# Altium schematic symbol library Wurth_Elektronik_Passive_rev16a.SCHLIB: 1143 symbols (part 3 of 27)
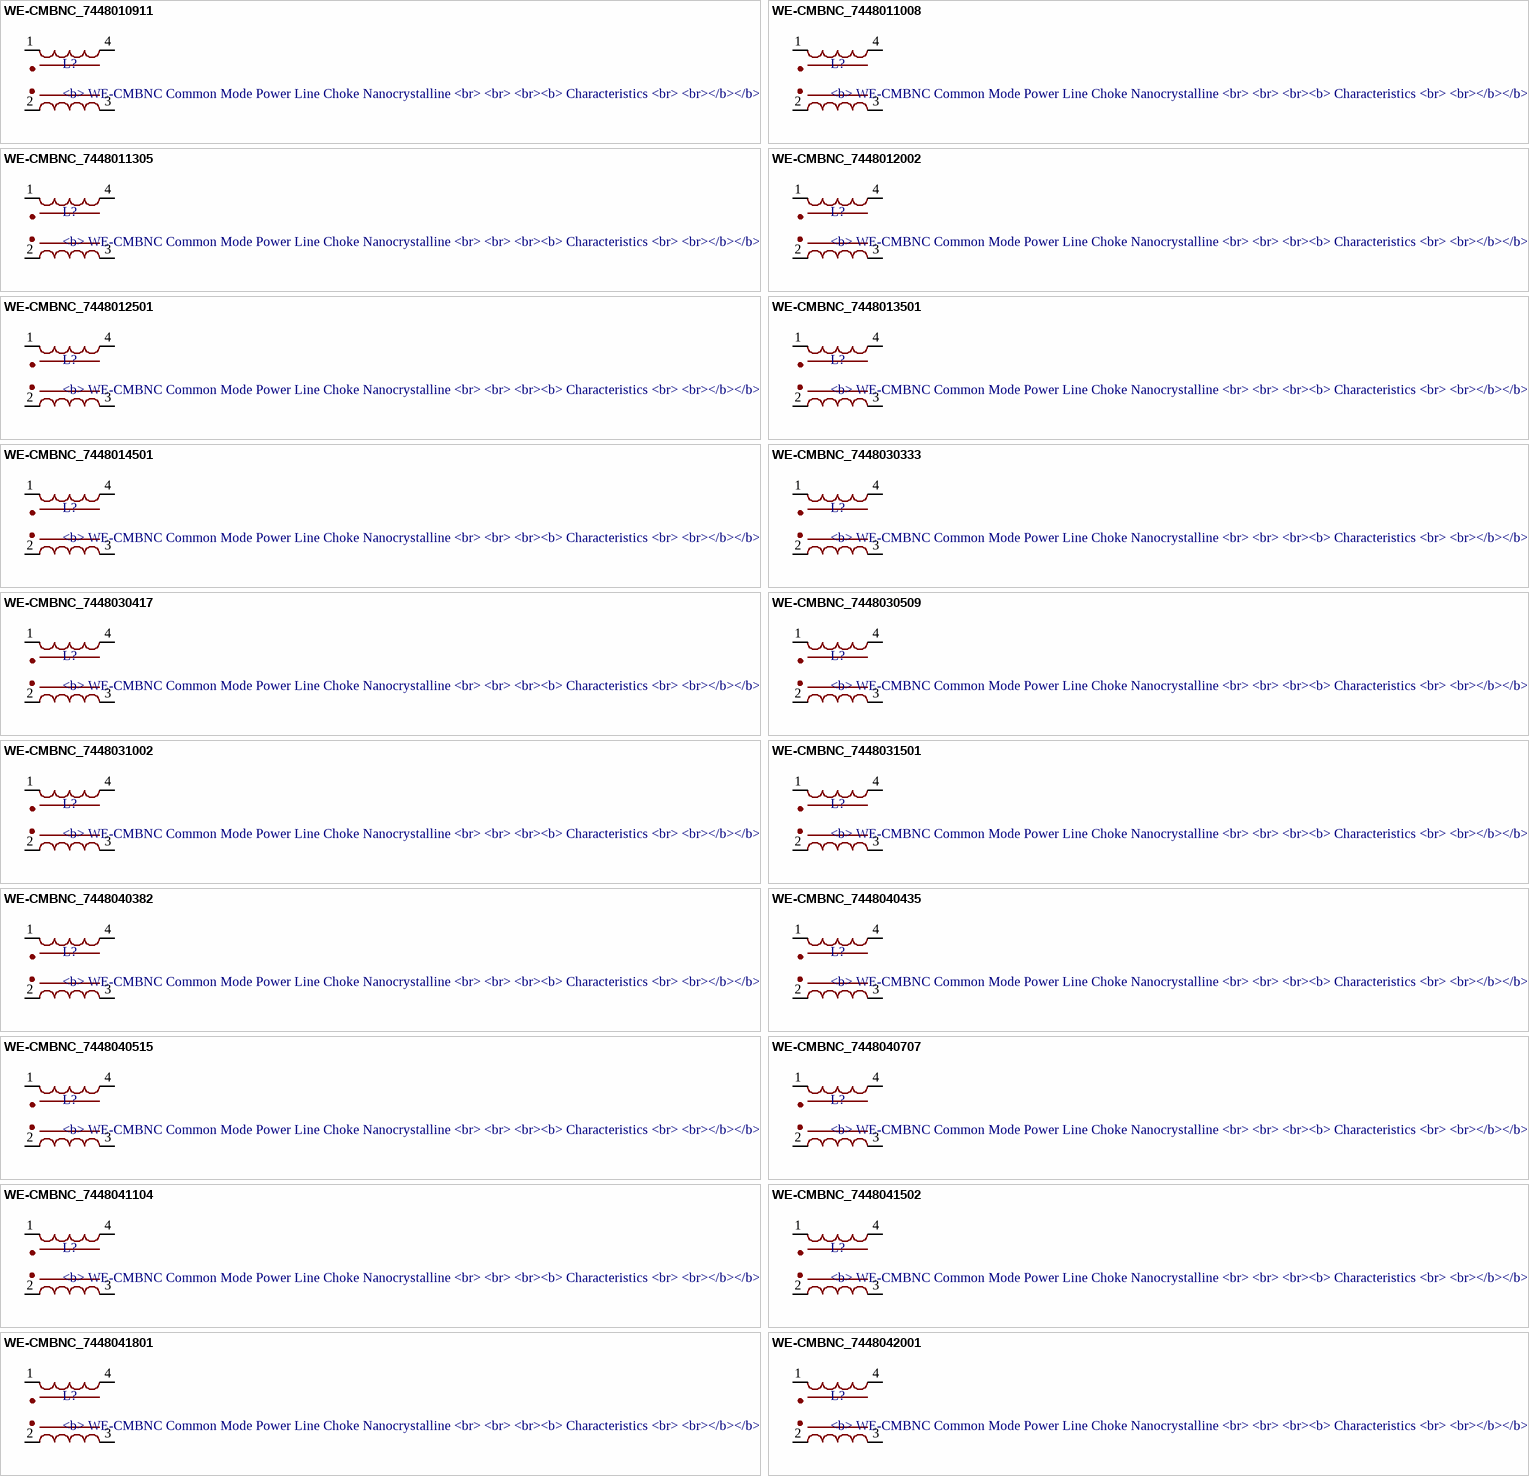
[diagram p60: symbols WE-CMBNC_7448010911 to WE-CMBNC_7448042001]

## WE-CMBNC_7448041104
designator L?, comment <b> WE-CMBNC Common Mode Power Line Choke Nanocrystalline / <br> / <br> / <br><b> Characteristics / <br> / <br></b></b> Very high permeability nanocrystalline core material / <br> / <br> Improved isolation through plastic case and winding spacer / <br> / <br>  High and stable inductance values at high temperatures / <br> / <br> High rated currents / <br> / <br> Broadband suppression / <br> / <br>  Small size / <br> / <br> Frequency range: 1 kHz-300 MHz / <br> / <br> Operating temperature: -40°C to +125°C / <br> / <br> / <br><b> Applications / <br> / <br></b> Power electronics / <br> / <br>  Power line in- and output filter / <br> / <br>  Radio interference suppression in motors / <br> / <br> Suppression for common mode noise / <br> / <br> / <br> / <br><a href="http://katalog.we-online.de/media/images/eisos/IndCMBNC_pf2.jpg" title="Enlarge picture"> / <img src="http://katalog.we-online.de/media/thumbs2/eisos/thb_IndCMBNC_pf2.jpg" width="320"></a><p> / Details see: <a href="http://katalog.we-online.de/en/pbs/WE-CMBNC/">http://katalog.we-online.de/en/pbs/WE-CMBNC/</a><p> / Updated by  Dan Xu 2014-06-23<br> / 2014 (C) Wurth Elektronik
footprint WE-CMBNC_L(WITHOUT-PINS)_7448041104
pins: 1, 2 4, 3, 4 2

## WE-CMBNC_7448041502
designator L?, comment <b> WE-CMBNC Common Mode Power Line Choke Nanocrystalline / <br> / <br> / <br><b> Characteristics / <br> / <br></b></b> Very high permeability nanocrystalline core material / <br> / <br> Improved isolation through plastic case and winding spacer / <br> / <br>  High and stable inductance values at high temperatures / <br> / <br> High rated currents / <br> / <br> Broadband suppression / <br> / <br>  Small size / <br> / <br> Frequency range: 1 kHz-300 MHz / <br> / <br> Operating temperature: -40°C to +125°C / <br> / <br> / <br><b> Applications / <br> / <br></b> Power electronics / <br> / <br>  Power line in- and output filter / <br> / <br>  Radio interference suppression in motors / <br> / <br> Suppression for common mode noise / <br> / <br> / <br> / <br><a href="http://katalog.we-online.de/media/images/eisos/IndCMBNC_pf2.jpg" title="Enlarge picture"> / <img src="http://katalog.we-online.de/media/thumbs2/eisos/thb_IndCMBNC_pf2.jpg" width="320"></a><p> / Details see: <a href="http://katalog.we-online.de/en/pbs/WE-CMBNC/">http://katalog.we-online.de/en/pbs/WE-CMBNC/</a><p> / Updated by  Dan Xu 2014-06-23<br> / 2014 (C) Wurth Elektronik
footprint WE-CMBNC_L(WITHOUT-PINS)_7448041502
pins: 1, 2 4, 3, 4 2

## WE-CMBNC_7448041801
designator L?, comment <b> WE-CMBNC Common Mode Power Line Choke Nanocrystalline / <br> / <br> / <br><b> Characteristics / <br> / <br></b></b> Very high permeability nanocrystalline core material / <br> / <br> Improved isolation through plastic case and winding spacer / <br> / <br>  High and stable inductance values at high temperatures / <br> / <br> High rated currents / <br> / <br> Broadband suppression / <br> / <br>  Small size / <br> / <br> Frequency range: 1 kHz-300 MHz / <br> / <br> Operating temperature: -40°C to +125°C / <br> / <br> / <br><b> Applications / <br> / <br></b> Power electronics / <br> / <br>  Power line in- and output filter / <br> / <br>  Radio interference suppression in motors / <br> / <br> Suppression for common mode noise / <br> / <br> / <br> / <br><a href="http://katalog.we-online.de/media/images/eisos/IndCMBNC_pf2.jpg" title="Enlarge picture"> / <img src="http://katalog.we-online.de/media/thumbs2/eisos/thb_IndCMBNC_pf2.jpg" width="320"></a><p> / Details see: <a href="http://katalog.we-online.de/en/pbs/WE-CMBNC/">http://katalog.we-online.de/en/pbs/WE-CMBNC/</a><p> / Updated by  Dan Xu 2014-06-23<br> / 2014 (C) Wurth Elektronik
footprint WE-CMBNC_L(WITHOUT-PINS)_7448041801
pins: 1, 2 4, 3, 4 2

## WE-CMBNC_7448042001
designator L?, comment <b> WE-CMBNC Common Mode Power Line Choke Nanocrystalline / <br> / <br> / <br><b> Characteristics / <br> / <br></b></b> Very high permeability nanocrystalline core material / <br> / <br> Improved isolation through plastic case and winding spacer / <br> / <br>  High and stable inductance values at high temperatures / <br> / <br> High rated currents / <br> / <br> Broadband suppression / <br> / <br>  Small size / <br> / <br> Frequency range: 1 kHz-300 MHz / <br> / <br> Operating temperature: -40°C to +125°C / <br> / <br> / <br><b> Applications / <br> / <br></b> Power electronics / <br> / <br>  Power line in- and output filter / <br> / <br>  Radio interference suppression in motors / <br> / <br> Suppression for common mode noise / <br> / <br> / <br> / <br><a href="http://katalog.we-online.de/media/images/eisos/IndCMBNC_pf2.jpg" title="Enlarge picture"> / <img src="http://katalog.we-online.de/media/thumbs2/eisos/thb_IndCMBNC_pf2.jpg" width="320"></a><p> / Details see: <a href="http://katalog.we-online.de/en/pbs/WE-CMBNC/">http://katalog.we-online.de/en/pbs/WE-CMBNC/</a><p> / Updated by  Dan Xu 2014-06-23<br> / 2014 (C) Wurth Elektronik
footprint WE-CMBNC_L(WITHOUT-PINS)_7448042001
pins: 1, 2 4, 3, 4 2

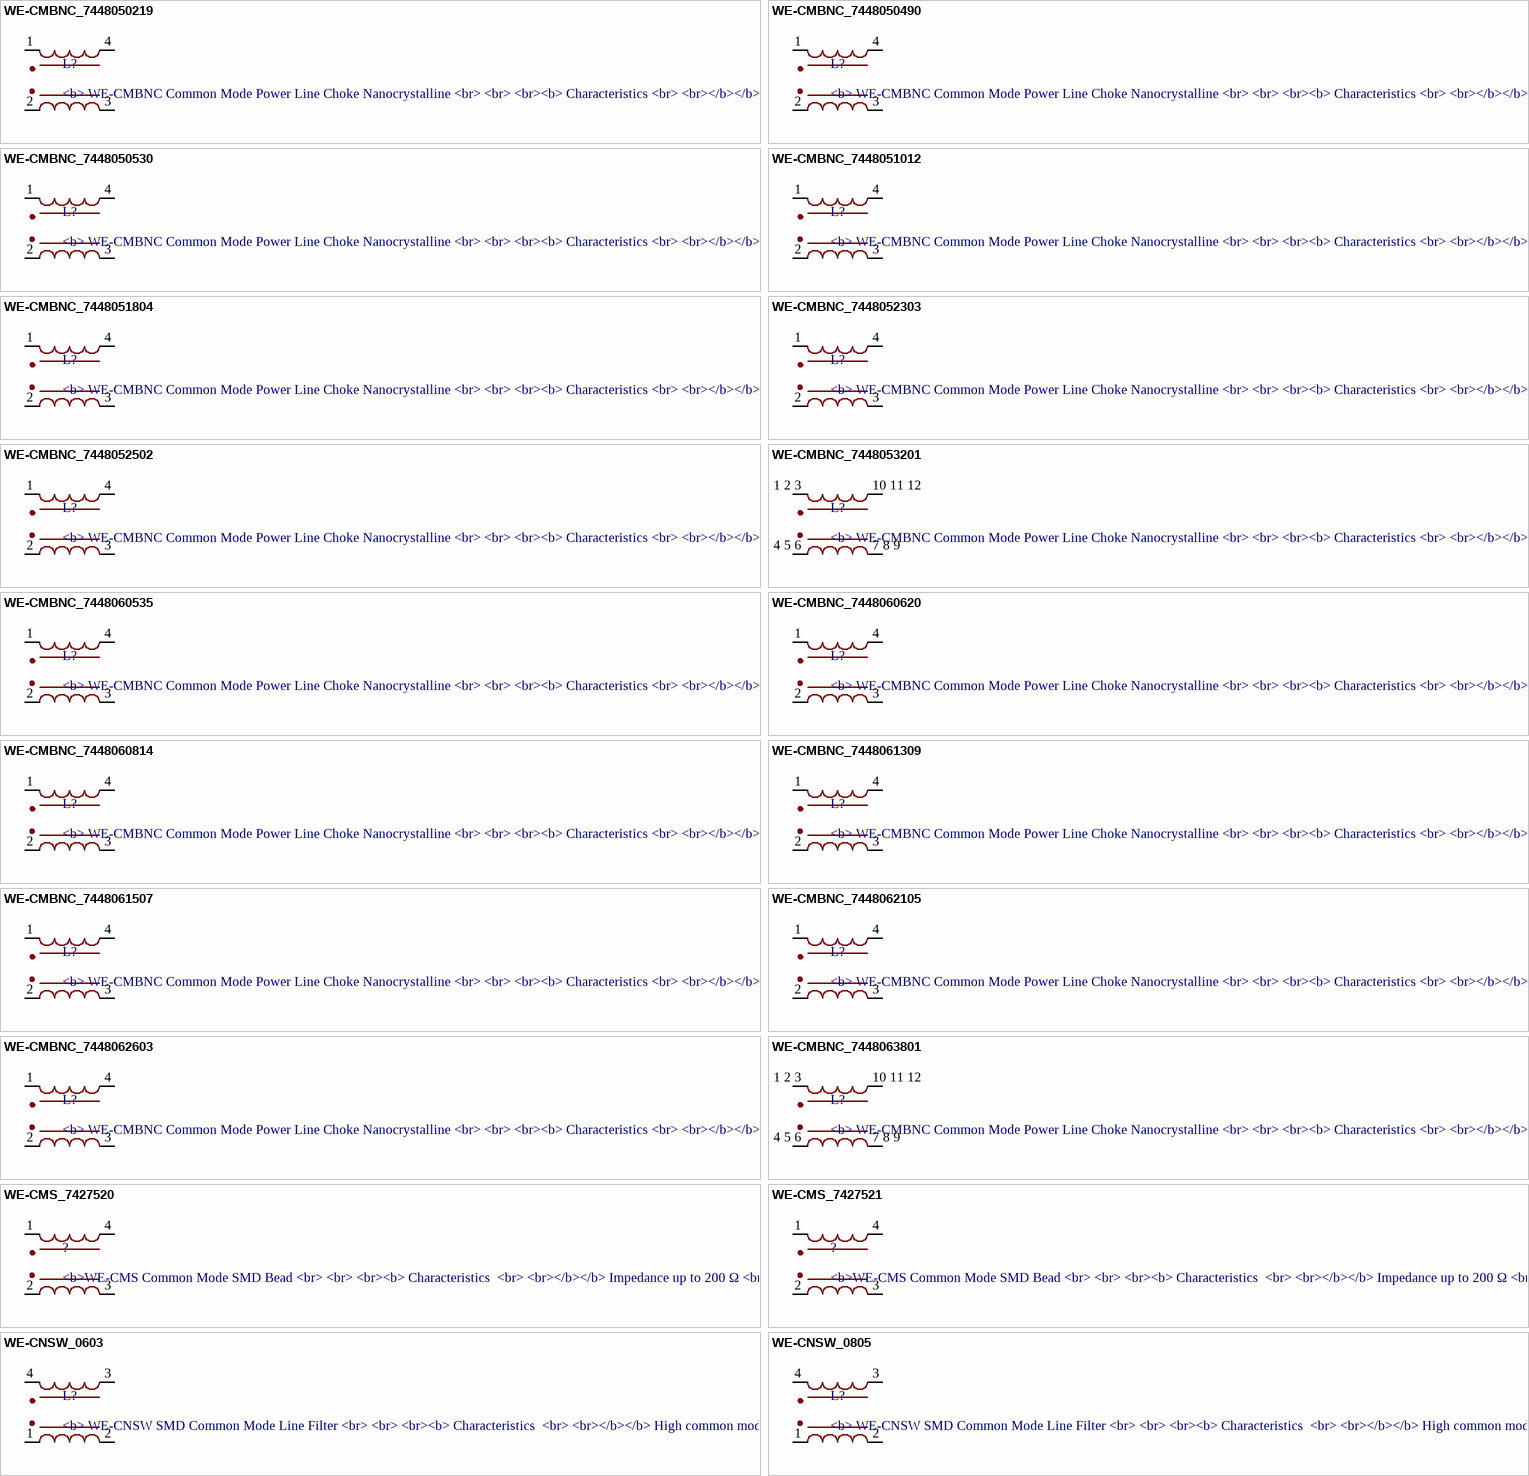
[diagram p3: symbols WE-CMBNC_7448050219 to WE-CNSW_0805]

## WE-CMBNC_7448050219
designator L?, comment <b> WE-CMBNC Common Mode Power Line Choke Nanocrystalline / <br> / <br> / <br><b> Characteristics / <br> / <br></b></b> Very high permeability nanocrystalline core material / <br> / <br> Improved isolation through plastic case and winding spacer / <br> / <br>  High and stable inductance values at high temperatures / <br> / <br> High rated currents / <br> / <br> Broadband suppression / <br> / <br>  Small size / <br> / <br> Frequency range: 1 kHz-300 MHz / <br> / <br> Operating temperature: -40°C to +125°C / <br> / <br> / <br><b> Applications / <br> / <br></b> Power electronics / <br> / <br>  Power line in- and output filter / <br> / <br>  Radio interference suppression in motors / <br> / <br> Suppression for common mode noise / <br> / <br> / <br> / <br><a href="http://katalog.we-online.de/media/images/eisos/IndCMBNC_pf2.jpg" title="Enlarge picture"> / <img src="http://katalog.we-online.de/media/thumbs2/eisos/thb_IndCMBNC_pf2.jpg" width="320"></a><p> / Details see: <a href="http://katalog.we-online.de/en/pbs/WE-CMBNC/">http://katalog.we-online.de/en/pbs/WE-CMBNC/</a><p> / Updated by  Dan Xu 2014-06-23<br> / 2014 (C) Wurth Elektronik
footprint WE-CMBNC_XL_7448050219
pins: 1, 2 4, 3, 4 2

## WE-CMBNC_7448050490
designator L?, comment <b> WE-CMBNC Common Mode Power Line Choke Nanocrystalline / <br> / <br> / <br><b> Characteristics / <br> / <br></b></b> Very high permeability nanocrystalline core material / <br> / <br> Improved isolation through plastic case and winding spacer / <br> / <br>  High and stable inductance values at high temperatures / <br> / <br> High rated currents / <br> / <br> Broadband suppression / <br> / <br>  Small size / <br> / <br> Frequency range: 1 kHz-300 MHz / <br> / <br> Operating temperature: -40°C to +125°C / <br> / <br> / <br><b> Applications / <br> / <br></b> Power electronics / <br> / <br>  Power line in- and output filter / <br> / <br>  Radio interference suppression in motors / <br> / <br> Suppression for common mode noise / <br> / <br> / <br> / <br><a href="http://katalog.we-online.de/media/images/eisos/IndCMBNC_pf2.jpg" title="Enlarge picture"> / <img src="http://katalog.we-online.de/media/thumbs2/eisos/thb_IndCMBNC_pf2.jpg" width="320"></a><p> / Details see: <a href="http://katalog.we-online.de/en/pbs/WE-CMBNC/">http://katalog.we-online.de/en/pbs/WE-CMBNC/</a><p> / Updated by  Dan Xu 2014-06-23<br> / 2014 (C) Wurth Elektronik
footprint WE-CMBNC_XL_7448050490
pins: 1, 2 4, 3, 4 2

## WE-CMBNC_7448050530
designator L?, comment <b> WE-CMBNC Common Mode Power Line Choke Nanocrystalline / <br> / <br> / <br><b> Characteristics / <br> / <br></b></b> Very high permeability nanocrystalline core material / <br> / <br> Improved isolation through plastic case and winding spacer / <br> / <br>  High and stable inductance values at high temperatures / <br> / <br> High rated currents / <br> / <br> Broadband suppression / <br> / <br>  Small size / <br> / <br> Frequency range: 1 kHz-300 MHz / <br> / <br> Operating temperature: -40°C to +125°C / <br> / <br> / <br><b> Applications / <br> / <br></b> Power electronics / <br> / <br>  Power line in- and output filter / <br> / <br>  Radio interference suppression in motors / <br> / <br> Suppression for common mode noise / <br> / <br> / <br> / <br><a href="http://katalog.we-online.de/media/images/eisos/IndCMBNC_pf2.jpg" title="Enlarge picture"> / <img src="http://katalog.we-online.de/media/thumbs2/eisos/thb_IndCMBNC_pf2.jpg" width="320"></a><p> / Details see: <a href="http://katalog.we-online.de/en/pbs/WE-CMBNC/">http://katalog.we-online.de/en/pbs/WE-CMBNC/</a><p> / Updated by  Dan Xu 2014-06-23<br> / 2014 (C) Wurth Elektronik
footprint WE-CMBNC_XL(WITHOUT-PINS)_7448050530
pins: 1, 2 4, 3, 4 2

## WE-CMBNC_7448051012
designator L?, comment <b> WE-CMBNC Common Mode Power Line Choke Nanocrystalline / <br> / <br> / <br><b> Characteristics / <br> / <br></b></b> Very high permeability nanocrystalline core material / <br> / <br> Improved isolation through plastic case and winding spacer / <br> / <br>  High and stable inductance values at high temperatures / <br> / <br> High rated currents / <br> / <br> Broadband suppression / <br> / <br>  Small size / <br> / <br> Frequency range: 1 kHz-300 MHz / <br> / <br> Operating temperature: -40°C to +125°C / <br> / <br> / <br><b> Applications / <br> / <br></b> Power electronics / <br> / <br>  Power line in- and output filter / <br> / <br>  Radio interference suppression in motors / <br> / <br> Suppression for common mode noise / <br> / <br> / <br> / <br><a href="http://katalog.we-online.de/media/images/eisos/IndCMBNC_pf2.jpg" title="Enlarge picture"> / <img src="http://katalog.we-online.de/media/thumbs2/eisos/thb_IndCMBNC_pf2.jpg" width="320"></a><p> / Details see: <a href="http://katalog.we-online.de/en/pbs/WE-CMBNC/">http://katalog.we-online.de/en/pbs/WE-CMBNC/</a><p> / Updated by  Dan Xu 2014-06-23<br> / 2014 (C) Wurth Elektronik
footprint WE-CMBNC_XL(WITHOUT-PINS)_7448051012
pins: 1, 2 4, 3, 4 2

## WE-CMBNC_7448051804
designator L?, comment <b> WE-CMBNC Common Mode Power Line Choke Nanocrystalline / <br> / <br> / <br><b> Characteristics / <br> / <br></b></b> Very high permeability nanocrystalline core material / <br> / <br> Improved isolation through plastic case and winding spacer / <br> / <br>  High and stable inductance values at high temperatures / <br> / <br> High rated currents / <br> / <br> Broadband suppression / <br> / <br>  Small size / <br> / <br> Frequency range: 1 kHz-300 MHz / <br> / <br> Operating temperature: -40°C to +125°C / <br> / <br> / <br><b> Applications / <br> / <br></b> Power electronics / <br> / <br>  Power line in- and output filter / <br> / <br>  Radio interference suppression in motors / <br> / <br> Suppression for common mode noise / <br> / <br> / <br> / <br><a href="http://katalog.we-online.de/media/images/eisos/IndCMBNC_pf2.jpg" title="Enlarge picture"> / <img src="http://katalog.we-online.de/media/thumbs2/eisos/thb_IndCMBNC_pf2.jpg" width="320"></a><p> / Details see: <a href="http://katalog.we-online.de/en/pbs/WE-CMBNC/">http://katalog.we-online.de/en/pbs/WE-CMBNC/</a><p> / Updated by  Dan Xu 2014-06-23<br> / 2014 (C) Wurth Elektronik
footprint WE-CMBNC_XL(WITHOUT-PINS)_7448051804
pins: 1, 2 4, 3, 4 2

## WE-CMBNC_7448052303
designator L?, comment <b> WE-CMBNC Common Mode Power Line Choke Nanocrystalline / <br> / <br> / <br><b> Characteristics / <br> / <br></b></b> Very high permeability nanocrystalline core material / <br> / <br> Improved isolation through plastic case and winding spacer / <br> / <br>  High and stable inductance values at high temperatures / <br> / <br> High rated currents / <br> / <br> Broadband suppression / <br> / <br>  Small size / <br> / <br> Frequency range: 1 kHz-300 MHz / <br> / <br> Operating temperature: -40°C to +125°C / <br> / <br> / <br><b> Applications / <br> / <br></b> Power electronics / <br> / <br>  Power line in- and output filter / <br> / <br>  Radio interference suppression in motors / <br> / <br> Suppression for common mode noise / <br> / <br> / <br> / <br><a href="http://katalog.we-online.de/media/images/eisos/IndCMBNC_pf2.jpg" title="Enlarge picture"> / <img src="http://katalog.we-online.de/media/thumbs2/eisos/thb_IndCMBNC_pf2.jpg" width="320"></a><p> / Details see: <a href="http://katalog.we-online.de/en/pbs/WE-CMBNC/">http://katalog.we-online.de/en/pbs/WE-CMBNC/</a><p> / Updated by  Dan Xu 2014-06-23<br> / 2014 (C) Wurth Elektronik
footprint WE-CMBNC_XL(WITHOUT-PINS)_7448052303
pins: 1, 2 4, 3, 4 2

## WE-CMBNC_7448052502
designator L?, comment <b> WE-CMBNC Common Mode Power Line Choke Nanocrystalline / <br> / <br> / <br><b> Characteristics / <br> / <br></b></b> Very high permeability nanocrystalline core material / <br> / <br> Improved isolation through plastic case and winding spacer / <br> / <br>  High and stable inductance values at high temperatures / <br> / <br> High rated currents / <br> / <br> Broadband suppression / <br> / <br>  Small size / <br> / <br> Frequency range: 1 kHz-300 MHz / <br> / <br> Operating temperature: -40°C to +125°C / <br> / <br> / <br><b> Applications / <br> / <br></b> Power electronics / <br> / <br>  Power line in- and output filter / <br> / <br>  Radio interference suppression in motors / <br> / <br> Suppression for common mode noise / <br> / <br> / <br> / <br><a href="http://katalog.we-online.de/media/images/eisos/IndCMBNC_pf2.jpg" title="Enlarge picture"> / <img src="http://katalog.we-online.de/media/thumbs2/eisos/thb_IndCMBNC_pf2.jpg" width="320"></a><p> / Details see: <a href="http://katalog.we-online.de/en/pbs/WE-CMBNC/">http://katalog.we-online.de/en/pbs/WE-CMBNC/</a><p> / Updated by  Dan Xu 2014-06-23<br> / 2014 (C) Wurth Elektronik
footprint WE-CMBNC_XL(WITHOUT-PINS)_7448052502
pins: 1, 2 4, 3, 4 2

## WE-CMBNC_7448053201
designator L?, comment <b> WE-CMBNC Common Mode Power Line Choke Nanocrystalline / <br> / <br> / <br><b> Characteristics / <br> / <br></b></b> Very high permeability nanocrystalline core material / <br> / <br> Improved isolation through plastic case and winding spacer / <br> / <br>  High and stable inductance values at high temperatures / <br> / <br> High rated currents / <br> / <br> Broadband suppression / <br> / <br>  Small size / <br> / <br> Frequency range: 1 kHz-300 MHz / <br> / <br> Operating temperature: -40°C to +125°C / <br> / <br> / <br><b> Applications / <br> / <br></b> Power electronics / <br> / <br>  Power line in- and output filter / <br> / <br>  Radio interference suppression in motors / <br> / <br> Suppression for common mode noise / <br> / <br> / <br> / <br><a href="http://katalog.we-online.de/media/images/eisos/IndCMBNC_pf2.jpg" title="Enlarge picture"> / <img src="http://katalog.we-online.de/media/thumbs2/eisos/thb_IndCMBNC_pf2.jpg" width="320"></a><p> / Details see: <a href="http://katalog.we-online.de/en/pbs/WE-CMBNC/">http://katalog.we-online.de/en/pbs/WE-CMBNC/</a><p> / Updated by  Dan Xu 2014-06-23<br> / 2014 (C) Wurth Elektronik
footprint WE-CMBNC_XL(WITHOUT-PINS)_7448053201
pins: 1 2 3 1, 4 5 6 4, 7 8 9 3, 10 11 12 2

## WE-CMBNC_7448060535
designator L?, comment <b> WE-CMBNC Common Mode Power Line Choke Nanocrystalline / <br> / <br> / <br><b> Characteristics / <br> / <br></b></b> Very high permeability nanocrystalline core material / <br> / <br> Improved isolation through plastic case and winding spacer / <br> / <br>  High and stable inductance values at high temperatures / <br> / <br> High rated currents / <br> / <br> Broadband suppression / <br> / <br>  Small size / <br> / <br> Frequency range: 1 kHz-300 MHz / <br> / <br> Operating temperature: -40°C to +125°C / <br> / <br> / <br><b> Applications / <br> / <br></b> Power electronics / <br> / <br>  Power line in- and output filter / <br> / <br>  Radio interference suppression in motors / <br> / <br> Suppression for common mode noise / <br> / <br> / <br> / <br><a href="http://katalog.we-online.de/media/images/eisos/IndCMBNC_pf2.jpg" title="Enlarge picture"> / <img src="http://katalog.we-online.de/media/thumbs2/eisos/thb_IndCMBNC_pf2.jpg" width="320"></a><p> / Details see: <a href="http://katalog.we-online.de/en/pbs/WE-CMBNC/">http://katalog.we-online.de/en/pbs/WE-CMBNC/</a><p> / Updated by  Dan Xu 2014-06-23<br> / 2014 (C) Wurth Elektronik
footprint WE-CMBNC_XXL_7448060535
pins: 1, 2 4, 3, 4 2

## WE-CMBNC_7448060620
designator L?, comment <b> WE-CMBNC Common Mode Power Line Choke Nanocrystalline / <br> / <br> / <br><b> Characteristics / <br> / <br></b></b> Very high permeability nanocrystalline core material / <br> / <br> Improved isolation through plastic case and winding spacer / <br> / <br>  High and stable inductance values at high temperatures / <br> / <br> High rated currents / <br> / <br> Broadband suppression / <br> / <br>  Small size / <br> / <br> Frequency range: 1 kHz-300 MHz / <br> / <br> Operating temperature: -40°C to +125°C / <br> / <br> / <br><b> Applications / <br> / <br></b> Power electronics / <br> / <br>  Power line in- and output filter / <br> / <br>  Radio interference suppression in motors / <br> / <br> Suppression for common mode noise / <br> / <br> / <br> / <br><a href="http://katalog.we-online.de/media/images/eisos/IndCMBNC_pf2.jpg" title="Enlarge picture"> / <img src="http://katalog.we-online.de/media/thumbs2/eisos/thb_IndCMBNC_pf2.jpg" width="320"></a><p> / Details see: <a href="http://katalog.we-online.de/en/pbs/WE-CMBNC/">http://katalog.we-online.de/en/pbs/WE-CMBNC/</a><p> / Updated by  Dan Xu 2014-06-23<br> / 2014 (C) Wurth Elektronik
footprint WE-CMBNC_XXL_7448060620
pins: 1, 2 4, 3, 4 2

## WE-CMBNC_7448060814
designator L?, comment <b> WE-CMBNC Common Mode Power Line Choke Nanocrystalline / <br> / <br> / <br><b> Characteristics / <br> / <br></b></b> Very high permeability nanocrystalline core material / <br> / <br> Improved isolation through plastic case and winding spacer / <br> / <br>  High and stable inductance values at high temperatures / <br> / <br> High rated currents / <br> / <br> Broadband suppression / <br> / <br>  Small size / <br> / <br> Frequency range: 1 kHz-300 MHz / <br> / <br> Operating temperature: -40°C to +125°C / <br> / <br> / <br><b> Applications / <br> / <br></b> Power electronics / <br> / <br>  Power line in- and output filter / <br> / <br>  Radio interference suppression in motors / <br> / <br> Suppression for common mode noise / <br> / <br> / <br> / <br><a href="http://katalog.we-online.de/media/images/eisos/IndCMBNC_pf2.jpg" title="Enlarge picture"> / <img src="http://katalog.we-online.de/media/thumbs2/eisos/thb_IndCMBNC_pf2.jpg" width="320"></a><p> / Details see: <a href="http://katalog.we-online.de/en/pbs/WE-CMBNC/">http://katalog.we-online.de/en/pbs/WE-CMBNC/</a><p> / Updated by  Dan Xu 2014-06-23<br> / 2014 (C) Wurth Elektronik
footprint WE-CMBNC_XXL_7448060814
pins: 1, 2 4, 3, 4 2

## WE-CMBNC_7448061309
designator L?, comment <b> WE-CMBNC Common Mode Power Line Choke Nanocrystalline / <br> / <br> / <br><b> Characteristics / <br> / <br></b></b> Very high permeability nanocrystalline core material / <br> / <br> Improved isolation through plastic case and winding spacer / <br> / <br>  High and stable inductance values at high temperatures / <br> / <br> High rated currents / <br> / <br> Broadband suppression / <br> / <br>  Small size / <br> / <br> Frequency range: 1 kHz-300 MHz / <br> / <br> Operating temperature: -40°C to +125°C / <br> / <br> / <br><b> Applications / <br> / <br></b> Power electronics / <br> / <br>  Power line in- and output filter / <br> / <br>  Radio interference suppression in motors / <br> / <br> Suppression for common mode noise / <br> / <br> / <br> / <br><a href="http://katalog.we-online.de/media/images/eisos/IndCMBNC_pf2.jpg" title="Enlarge picture"> / <img src="http://katalog.we-online.de/media/thumbs2/eisos/thb_IndCMBNC_pf2.jpg" width="320"></a><p> / Details see: <a href="http://katalog.we-online.de/en/pbs/WE-CMBNC/">http://katalog.we-online.de/en/pbs/WE-CMBNC/</a><p> / Updated by  Dan Xu 2014-06-23<br> / 2014 (C) Wurth Elektronik
footprint WE-CMBNC_XXL_7448061309
pins: 1, 2 4, 3, 4 2

## WE-CMBNC_7448061507
designator L?, comment <b> WE-CMBNC Common Mode Power Line Choke Nanocrystalline / <br> / <br> / <br><b> Characteristics / <br> / <br></b></b> Very high permeability nanocrystalline core material / <br> / <br> Improved isolation through plastic case and winding spacer / <br> / <br>  High and stable inductance values at high temperatures / <br> / <br> High rated currents / <br> / <br> Broadband suppression / <br> / <br>  Small size / <br> / <br> Frequency range: 1 kHz-300 MHz / <br> / <br> Operating temperature: -40°C to +125°C / <br> / <br> / <br><b> Applications / <br> / <br></b> Power electronics / <br> / <br>  Power line in- and output filter / <br> / <br>  Radio interference suppression in motors / <br> / <br> Suppression for common mode noise / <br> / <br> / <br> / <br><a href="http://katalog.we-online.de/media/images/eisos/IndCMBNC_pf2.jpg" title="Enlarge picture"> / <img src="http://katalog.we-online.de/media/thumbs2/eisos/thb_IndCMBNC_pf2.jpg" width="320"></a><p> / Details see: <a href="http://katalog.we-online.de/en/pbs/WE-CMBNC/">http://katalog.we-online.de/en/pbs/WE-CMBNC/</a><p> / Updated by  Dan Xu 2014-06-23<br> / 2014 (C) Wurth Elektronik
footprint WE-CMBNC_XXL_7448061507
pins: 1, 2 4, 3, 4 2

## WE-CMBNC_7448062105
designator L?, comment <b> WE-CMBNC Common Mode Power Line Choke Nanocrystalline / <br> / <br> / <br><b> Characteristics / <br> / <br></b></b> Very high permeability nanocrystalline core material / <br> / <br> Improved isolation through plastic case and winding spacer / <br> / <br>  High and stable inductance values at high temperatures / <br> / <br> High rated currents / <br> / <br> Broadband suppression / <br> / <br>  Small size / <br> / <br> Frequency range: 1 kHz-300 MHz / <br> / <br> Operating temperature: -40°C to +125°C / <br> / <br> / <br><b> Applications / <br> / <br></b> Power electronics / <br> / <br>  Power line in- and output filter / <br> / <br>  Radio interference suppression in motors / <br> / <br> Suppression for common mode noise / <br> / <br> / <br> / <br><a href="http://katalog.we-online.de/media/images/eisos/IndCMBNC_pf2.jpg" title="Enlarge picture"> / <img src="http://katalog.we-online.de/media/thumbs2/eisos/thb_IndCMBNC_pf2.jpg" width="320"></a><p> / Details see: <a href="http://katalog.we-online.de/en/pbs/WE-CMBNC/">http://katalog.we-online.de/en/pbs/WE-CMBNC/</a><p> / Updated by  Dan Xu 2014-06-23<br> / 2014 (C) Wurth Elektronik
footprint WE-CMBNC_XXL_7448062105
pins: 1, 2 4, 3, 4 2

## WE-CMBNC_7448062603
designator L?, comment <b> WE-CMBNC Common Mode Power Line Choke Nanocrystalline / <br> / <br> / <br><b> Characteristics / <br> / <br></b></b> Very high permeability nanocrystalline core material / <br> / <br> Improved isolation through plastic case and winding spacer / <br> / <br>  High and stable inductance values at high temperatures / <br> / <br> High rated currents / <br> / <br> Broadband suppression / <br> / <br>  Small size / <br> / <br> Frequency range: 1 kHz-300 MHz / <br> / <br> Operating temperature: -40°C to +125°C / <br> / <br> / <br><b> Applications / <br> / <br></b> Power electronics / <br> / <br>  Power line in- and output filter / <br> / <br>  Radio interference suppression in motors / <br> / <br> Suppression for common mode noise / <br> / <br> / <br> / <br><a href="http://katalog.we-online.de/media/images/eisos/IndCMBNC_pf2.jpg" title="Enlarge picture"> / <img src="http://katalog.we-online.de/media/thumbs2/eisos/thb_IndCMBNC_pf2.jpg" width="320"></a><p> / Details see: <a href="http://katalog.we-online.de/en/pbs/WE-CMBNC/">http://katalog.we-online.de/en/pbs/WE-CMBNC/</a><p> / Updated by  Dan Xu 2014-06-23<br> / 2014 (C) Wurth Elektronik
footprint WE-CMBNC_XXL_7448062603
pins: 1, 2 4, 3, 4 2
